# Altium schematic symbol library Capacitor - Aluminium TH.SchLib: 4591 symbols (part 22 of 27) (continued)
## UPS2V010MPD1TD (continued)
CAP ALUM 1UF 20% 350V RADIAL; Part Number: UPS2V010MPD1TD; Manufacturer: Nichicon; TemperatureRange: -40C ~ 105C; Type: Polar; Ripple Current: 17mA @ 120Hz; Value: 1uF; PartId: 24895; Supplier 1: Digi-Key; Supplier Part Number 1: 493-11690-1-ND; ComponentLink1Description: Datasheet; ComponentLink1URL: http://nichicon-us.com/english/products/pdfs/e-ups.pdf; ComponentLink2Description: Digi-Key Listing; ComponentLink2URL: https://www.digikey.com/product-detail/en/nichicon/UPS2V010MPD1TD/493-11690-1-ND/4319779; Tolerance: 20%; Voltage: 350V; Price: 0.48; Device Package: Radial, Can, 10mm
footprint CAP AL TH D10 L5 H14.5
pins: 1, 2

## UPS2V100MHD1TO
designator C?, comment 10uF  (value not drawn)
CAP ALUM 10UF 20% 350V RADIAL; Part Number: UPS2V100MHD1TO; Manufacturer: Nichicon; TemperatureRange: -40C ~ 105C; Type: Polar; Ripple Current: 82mA @ 120Hz; Value: 10uF; PartId: 23254; Supplier 1: Digi-Key; Supplier Part Number 1: 493-11986-1-ND; ComponentLink1Description: Datasheet; ComponentLink1URL: http://nichicon-us.com/english/products/pdfs/e-ups.pdf; ComponentLink2Description: Digi-Key Listing; ComponentLink2URL: https://www.digikey.com/product-detail/en/nichicon/UPS2V100MHD1TO/493-11986-1-ND/4319780; Tolerance: 20%; Voltage: 350V; Price: 0.71; Device Package: Radial, Can, 12.5mm
footprint CAP AL TH D12.5 L5 H22
pins: 1, 2

## UPS2V220MHD1TN
designator C?, comment 22uF  (value not drawn)
CAP ALUM 22UF 20% 350V RADIAL; Part Number: UPS2V220MHD1TN; Manufacturer: Nichicon; TemperatureRange: -40C ~ 105C; Type: Polar; Ripple Current: 130mA @ 120Hz; Value: 22uF; PartId: 26735; Supplier 1: Digi-Key; Supplier Part Number 1: 493-5414-3-ND; ComponentLink1Description: Datasheet; ComponentLink1URL: http://nichicon-us.com/english/products/pdfs/e-ups.pdf; ComponentLink2Description: Digi-Key Listing; ComponentLink2URL: https://www.digikey.com/product-detail/en/nichicon/UPS2V220MHD1TN/493-5414-3-ND/3130419; Tolerance: 20%; Voltage: 350V; Price: 0.4664; Device Package: Radial, Can, 16mm
footprint CAP AL TH D16 L7.5 H27
pins: 1, 2

## UPS2V221MRD
designator C?, comment 220uF  (value not drawn)
CAP ALUM 220UF 20% 350V RADIAL; Part Number: UPS2V221MRD; Manufacturer: Nichicon; TemperatureRange: -40C ~ 105C; Type: Polar; Ripple Current: 550mA; Value: 220uF; PartId: 27530; Supplier 1: Digi-Key; Supplier Part Number 1: 493-11161-ND; ComponentLink1Description: Datasheet; ComponentLink1URL: http://nichicon-us.com/english/products/pdfs/e-ups.pdf; ComponentLink2Description: Digi-Key Listing; ComponentLink2URL: https://www.digikey.com/product-detail/en/nichicon/UPS2V221MRD/493-11161-ND/2600159; Tolerance: 20%; Voltage: 350V; Price: 4.42; Device Package: Radial, Can, 25mm
footprint CAP AL TH D25 L12.5 H52
pins: 1, 2

## UPS2V330MHD
designator C?, comment 33uF  (value not drawn)
CAP ALUM 33UF 20% 350V RADIAL; Part Number: UPS2V330MHD; Manufacturer: Nichicon; TemperatureRange: -40C ~ 105C; Type: Polar; Ripple Current: 160mA @ 120Hz; Value: 33uF; PartId: 27103; Supplier 1: Digi-Key; Supplier Part Number 1: 493-5677-ND; ComponentLink1Description: Datasheet; ComponentLink1URL: http://nichicon-us.com/english/products/pdfs/e-ups.pdf; ComponentLink2Description: Digi-Key Listing; ComponentLink2URL: https://www.digikey.com/product-detail/en/nichicon/UPS2V330MHD/493-5677-ND/2600161; Tolerance: 20%; Voltage: 350V; Price: 1.74; Device Package: Radial, Can, 16mm
footprint CAP AL TH D16 L7.5 H33.5
pins: 1, 2

## UPS2W2R2MPD1TD
designator C?, comment 2.2uF  (value not drawn)
CAP ALUM 2.2UF 20% 450V RADIAL; Part Number: UPS2W2R2MPD1TD; Manufacturer: Nichicon; TemperatureRange: -25C ~ 105C; Type: Polar; Ripple Current: 29mA @ 120Hz; Value: 2.2uF; PartId: 25724; Supplier 1: Digi-Key; Supplier Part Number 1: 493-5418-3-ND; ComponentLink1Description: Datasheet; ComponentLink1URL: http://nichicon-us.com/english/products/pdfs/e-ups.pdf; ComponentLink2Description: Digi-Key Listing; ComponentLink2URL: https://www.digikey.com/product-detail/en/nichicon/UPS2W2R2MPD1TD/493-5418-3-ND/3130423; Tolerance: 20%; Voltage: 450V; Price: 0.1527; Device Package: Radial, Can, 10mm
footprint CAP AL TH D10 L5 H22
pins: 1, 2

## UPS2W3R3MHD1TO
designator C?, comment 3.3uF  (value not drawn)
CAP ALUM 3.3UF 20% 450V RADIAL; Part Number: UPS2W3R3MHD1TO; Manufacturer: Nichicon; TemperatureRange: -25C ~ 105C; Type: Polar; Ripple Current: 41mA @ 120Hz; Value: 3.3uF; PartId: 23121; Supplier 1: Digi-Key; Supplier Part Number 1: 493-5419-3-ND; ComponentLink1Description: Datasheet; ComponentLink1URL: http://nichicon-us.com/english/products/pdfs/e-ups.pdf; ComponentLink2Description: Digi-Key Listing; ComponentLink2URL: https://www.digikey.com/product-detail/en/nichicon/UPS2W3R3MHD1TO/493-5419-3-ND/3130424; Tolerance: 20%; Voltage: 450V; Price: 0.1678; Device Package: Radial, Can, 12.5mm
footprint CAP AL TH D12.5 L5 H22
pins: 1, 2

## UPS2W4R7MHD1TO
designator C?, comment 4.7uF  (value not drawn)
CAP ALUM 4.7UF 20% 450V RADIAL; Part Number: UPS2W4R7MHD1TO; Manufacturer: Nichicon; TemperatureRange: -25C ~ 105C; Type: Polar; Ripple Current: 49mA @ 120Hz; Value: 4.7uF; PartId: 23123; Supplier 1: Digi-Key; Supplier Part Number 1: 493-5420-3-ND; ComponentLink1Description: Datasheet; ComponentLink1URL: http://nichicon-us.com/english/products/pdfs/e-ups.pdf; ComponentLink2Description: Digi-Key Listing; ComponentLink2URL: https://www.digikey.com/product-detail/en/nichicon/UPS2W4R7MHD1TO/493-5420-3-ND/3130425; Tolerance: 20%; Voltage: 450V; Price: 0.2068; Device Package: Radial, Can, 12.5mm
footprint CAP AL TH D12.5 L5 H22
pins: 1, 2

## UPS2W010MPD
designator C?, comment 1uF  (value not drawn)
CAP ALUM 1UF 20% 450V RADIAL; Part Number: UPS2W010MPD; Manufacturer: Nichicon; TemperatureRange: -25C ~ 105C; Type: Polar; Ripple Current: 18mA @ 120Hz; Value: 1uF; PartId: 24934; Supplier 1: Digi-Key; Supplier Part Number 1: UPS2W010MPD-ND; ComponentLink1Description: Datasheet; ComponentLink1URL: http://nichicon-us.com/english/products/pdfs/e-ups.pdf; ComponentLink2Description: Digi-Key Listing; ComponentLink2URL: https://www.digikey.com/product-detail/en/nichicon/UPS2W010MPD/UPS2W010MPD-ND/2600167; Tolerance: 20%; Voltage: 450V; Price: 0.5; Device Package: Radial, Can, 10mm
footprint CAP AL TH D10 L5 H14.5
pins: 1, 2

## UPS2W010MPD1TD
designator C?, comment 1uF  (value not drawn)
CAP ALUM 1UF 20% 450V RADIAL; Part Number: UPS2W010MPD1TD; Manufacturer: Nichicon; TemperatureRange: -25C ~ 105C; Type: Polar; Ripple Current: 18mA @ 120Hz; Value: 1uF; PartId: 24513; Supplier 1: Digi-Key; Supplier Part Number 1: 493-11672-3-ND; ComponentLink1Description: Datasheet; ComponentLink1URL: http://nichicon-us.com/english/products/pdfs/e-ups.pdf; ComponentLink2Description: Digi-Key Listing; ComponentLink2URL: https://www.digikey.com/product-detail/en/nichicon/UPS2W010MPD1TD/493-11672-3-ND/4320815; Tolerance: 20%; Voltage: 450V; Price: 0.1273; Device Package: Radial, Can, 10mm
footprint CAP AL TH D10 L5 H14.5
pins: 1, 2

## UPS2W101MRD
designator C?, comment 100uF  (value not drawn)
CAP ALUM 100UF 20% 450V RADIAL; Part Number: UPS2W101MRD; Manufacturer: Nichicon; TemperatureRange: -25C ~ 105C; Type: Polar; Ripple Current: 350mA @ 120Hz; Value: 100uF; PartId: 27520; Supplier 1: Digi-Key; Supplier Part Number 1: 493-5680-ND; ComponentLink1Description: Datasheet; ComponentLink1URL: http://nichicon-us.com/english/products/pdfs/e-ups.pdf; ComponentLink2Description: Digi-Key Listing; ComponentLink2URL: https://www.digikey.com/product-detail/en/nichicon/UPS2W101MRD/493-5680-ND/2600169; Tolerance: 20%; Voltage: 450V; Price: 4.64; Device Package: Radial, Can, 25mm
footprint CAP AL TH D25 L12.5 H52
pins: 1, 2

## UPS2W220MHD
designator C?, comment 22uF  (value not drawn)
CAP ALUM 22UF 20% 450V RADIAL; Part Number: UPS2W220MHD; Manufacturer: Nichicon; TemperatureRange: -25C ~ 105C; Type: Polar; Ripple Current: 115mA; Value: 22uF; PartId: 26993; Supplier 1: Digi-Key; Supplier Part Number 1: 493-11162-ND; ComponentLink1Description: Datasheet; ComponentLink1URL: http://nichicon-us.com/english/products/pdfs/e-ups.pdf; ComponentLink2Description: Digi-Key Listing; ComponentLink2URL: https://www.digikey.com/product-detail/en/nichicon/UPS2W220MHD/493-11162-ND/2600170; Tolerance: 20%; Voltage: 450V; Price: 1.3; Device Package: Radial, Can, 16mm
footprint CAP AL TH D16 L7.5 H33.5
pins: 1, 2

## UPT2D101MHD
designator C?, comment 100uF  (value not drawn)
CAP ALUM 100UF 20% 200V RADIAL; Part Number: UPT2D101MHD; Manufacturer: Nichicon; TemperatureRange: -25C ~ 105C; Ripple Current: 480mA; Value: 100uF; PartId: 24330; Supplier 1: Digi-Key; Supplier Part Number 1: 493-11164-ND; ComponentLink1Description: Datasheet; ComponentLink1URL: http://nichicon-us.com/english/products/pdfs/e-upt.pdf; ComponentLink2Description: Digi-Key Listing; ComponentLink2URL: https://www.digikey.com/product-detail/en/nichicon/UPT2D101MHD/493-11164-ND/2600177; Tolerance: 20%; Voltage: 200V; Price: 1.29; Device Package: Radial, Can, 12.5mm
footprint CAP AL TH D12.5 L5 H35.5
pins: 1, 2

## UPT2D121MHD
designator C?, comment 120uF  (value not drawn)
CAP ALUM 120UF 20% 200V RADIAL; Part Number: UPT2D121MHD; Manufacturer: Nichicon; TemperatureRange: -25C ~ 105C; Ripple Current: 530mA; Value: 120uF; PartId: 24345; Supplier 1: Digi-Key; Supplier Part Number 1: 493-11165-ND; ComponentLink1Description: Datasheet; ComponentLink1URL: http://nichicon-us.com/english/products/pdfs/e-upt.pdf; ComponentLink2Description: Digi-Key Listing; ComponentLink2URL: https://www.digikey.com/product-detail/en/nichicon/UPT2D121MHD/493-11165-ND/1995781; Tolerance: 20%; Voltage: 200V; Price: 1.39; Device Package: Radial, Can, 12.5mm
footprint CAP AL TH D12.5 L5 H35.5
pins: 1, 2

## UPT2D221MHD
designator C?, comment 220uF  (value not drawn)
CAP ALUM 220UF 20% 200V RADIAL; Part Number: UPT2D221MHD; Manufacturer: Nichicon; TemperatureRange: -25C ~ 105C; Type: Polar; Ripple Current: 760mA @ 120Hz; Value: 220uF; PartId: 27203; Supplier 1: Digi-Key; Supplier Part Number 1: 493-5685-ND; ComponentLink1Description: Datasheet; ComponentLink1URL: http://nichicon-us.com/english/products/pdfs/e-upt.pdf; ComponentLink2Description: Digi-Key Listing; ComponentLink2URL: https://www.digikey.com/product-detail/en/nichicon/UPT2D221MHD/493-5685-ND/2600180; Tolerance: 20%; Voltage: 200V; Price: 2.1; Device Package: Radial, Can, 16mm
footprint CAP AL TH D16 L7.5 H33.5
pins: 1, 2

## UPT2D471MRD
designator C?, comment 470uF  (value not drawn)
CAP ALUM 470UF 20% 200V RADIAL; Part Number: UPT2D471MRD; Manufacturer: Nichicon; TemperatureRange: -25C ~ 105C; Ripple Current: 1.2A; Value: 470uF; PartId: 27576; Supplier 1: Digi-Key; Supplier Part Number 1: 493-11168-ND; ComponentLink1Description: Datasheet; ComponentLink1URL: http://nichicon-us.com/english/products/pdfs/e-upt.pdf; ComponentLink2Description: Digi-Key Listing; ComponentLink2URL: https://www.digikey.com/product-detail/en/nichicon/UPT2D471MRD/493-11168-ND/2600185; Tolerance: 20%; Voltage: 200V; Price: 3.73; Device Package: Radial, Can, 22mm
footprint CAP AL TH D22 L10 H43
pins: 1, 2

## UPT2D681MRD
designator C?, comment 680uF  (value not drawn)
CAP ALUM 680UF 20% 200V RADIAL; Part Number: UPT2D681MRD; Manufacturer: Nichicon; TemperatureRange: -25C ~ 105C; Ripple Current: 1.5A; Value: 680uF; PartId: 27630; Supplier 1: Digi-Key; Supplier Part Number 1: 493-11171-ND; ComponentLink1Description: Datasheet; ComponentLink1URL: http://nichicon-us.com/english/products/pdfs/e-upt.pdf; ComponentLink2Description: Digi-Key Listing; ComponentLink2URL: https://www.digikey.com/product-detail/en/nichicon/UPT2D681MRD/493-11171-ND/2600187; Tolerance: 20%; Voltage: 200V; Price: 4.57; Device Package: Radial, Can, 22mm
footprint CAP AL TH D22 L10 H53
pins: 1, 2

## UPT2D681MRD6
designator C?, comment 680uF  (value not drawn)
CAP ALUM 680UF 20% 200V RADIAL; Part Number: UPT2D681MRD6; Manufacturer: Nichicon; TemperatureRange: -25C ~ 105C; Ripple Current: 1.5A; Value: 680uF; PartId: 27486; Supplier 1: Digi-Key; Supplier Part Number 1: 493-11170-ND; ComponentLink1Description: Datasheet; ComponentLink1URL: http://nichicon-us.com/english/products/pdfs/e-upt.pdf; ComponentLink2Description: Digi-Key Listing; ComponentLink2URL: https://www.digikey.com/product-detail/en/nichicon/UPT2D681MRD6/493-11170-ND/2600188; Tolerance: 20%; Voltage: 200V; Price: 4.74; Device Package: Radial, Can, 25mm
footprint CAP AL TH D25 L12.5 H42
pins: 1, 2

## UPT2D820MHD1TO
designator C?, comment 82uF  (value not drawn)
CAP ALUM 82UF 20% 200V RADIAL; Part Number: UPT2D820MHD1TO; Manufacturer: Nichicon; TemperatureRange: -25C ~ 105C; Type: Polar; Ripple Current: 410mA @ 120Hz; Value: 82uF; PartId: 24102; Supplier 1: Digi-Key; Supplier Part Number 1: 493-12268-1-ND; ComponentLink1Description: Datasheet; ComponentLink1URL: http://nichicon-us.com/english/products/pdfs/e-upt.pdf; ComponentLink2Description: Digi-Key Listing; ComponentLink2URL: https://www.digikey.com/product-detail/en/nichicon/UPT2D820MHD1TO/493-12268-1-ND/4319784; Tolerance: 20%; Voltage: 200V; Price: 1.33; Device Package: Radial, Can, 12.5mm
footprint CAP AL TH D12.5 L5 H27
pins: 1, 2

## UPT2D821MRD
designator C?, comment 820uF  (value not drawn)
CAP ALUM 820UF 20% 200V RADIAL; Part Number: UPT2D821MRD; Manufacturer: Nichicon; TemperatureRange: -25C ~ 105C; Ripple Current: 1.6A; Value: 820uF; PartId: 27524; Supplier 1: Digi-Key; Supplier Part Number 1: 493-11172-ND; ComponentLink1Description: Datasheet; ComponentLink1URL: http://nichicon-us.com/english/products/pdfs/e-upt.pdf; ComponentLink2Description: Digi-Key Listing; ComponentLink2URL: https://www.digikey.com/product-detail/en/nichicon/UPT2D821MRD/493-11172-ND/2600190; Tolerance: 20%; Voltage: 200V; Price: 5.76; Device Package: Radial, Can, 25mm
footprint CAP AL TH D25 L12.5 H52
pins: 1, 2

## UPT2E151MHD
designator C?, comment 150uF  (value not drawn)
CAP ALUM 150UF 20% 250V RADIAL; Part Number: UPT2E151MHD; Manufacturer: Nichicon; TemperatureRange: -25C ~ 105C; Ripple Current: 620mA; Value: 150uF; PartId: 27197; Supplier 1: Digi-Key; Supplier Part Number 1: 493-11174-ND; ComponentLink1Description: Datasheet; ComponentLink1URL: http://nichicon-us.com/english/products/pdfs/e-upt.pdf; ComponentLink2Description: Digi-Key Listing; ComponentLink2URL: https://www.digikey.com/product-detail/en/nichicon/UPT2E151MHD/493-11174-ND/2600193; Tolerance: 20%; Voltage: 250V; Price: 2.06; Device Package: Radial, Can, 16mm
footprint CAP AL TH D16 L7.5 H33.5
pins: 1, 2

## UPT2E181MHD
designator C?, comment 180uF  (value not drawn)
CAP ALUM 180UF 20% 250V RADIAL; Part Number: UPT2E181MHD; Manufacturer: Nichicon; TemperatureRange: -25C ~ 105C; Type: Polar; Ripple Current: 720mA @ 120Hz; Value: 180uF; PartId: 27410; Supplier 1: Digi-Key; Supplier Part Number 1: 493-5689-ND; ComponentLink1Description: Datasheet; ComponentLink1URL: http://nichicon-us.com/english/products/pdfs/e-upt.pdf; ComponentLink2Description: Digi-Key Listing; ComponentLink2URL: https://www.digikey.com/product-detail/en/nichicon/UPT2E181MHD/493-5689-ND/2600194; Tolerance: 20%; Voltage: 250V; Price: 2.35; Device Package: Radial, Can, 16mm
footprint CAP AL TH D16 L7.5 H37
pins: 1, 2

## UPT2E331MRD
designator C?, comment 330uF  (value not drawn)
CAP ALUM 330UF 20% 250V RADIAL; Part Number: UPT2E331MRD; Manufacturer: Nichicon; TemperatureRange: -25C ~ 105C; Ripple Current: 1.05A; Value: 330uF; PartId: 27584; Supplier 1: Digi-Key; Supplier Part Number 1: 493-11313-ND; ComponentLink1Description: Datasheet; ComponentLink1URL: http://nichicon-us.com/english/products/pdfs/e-upt.pdf; ComponentLink2Description: Digi-Key Listing; ComponentLink2URL: https://www.digikey.com/product-detail/en/nichicon/UPT2E331MRD/493-11313-ND/4319378; Tolerance: 20%; Voltage: 250V; Price: 4.28; Device Package: Radial, Can, 22mm
footprint CAP AL TH D22 L10 H43
pins: 1, 2

## UPT2E471MRD
designator C?, comment 470uF  (value not drawn)
CAP ALUM 470UF 20% 250V RADIAL; Part Number: UPT2E471MRD; Manufacturer: Nichicon; TemperatureRange: -25C ~ 105C; Type: Polar; Ripple Current: 1.45A @ 120Hz; Value: 470uF; PartId: 27631; Supplier 1: Digi-Key; Supplier Part Number 1: 493-5693-ND; ComponentLink1Description: Datasheet; ComponentLink1URL: http://nichicon-us.com/english/products/pdfs/e-upt.pdf; ComponentLink2Description: Digi-Key Listing; ComponentLink2URL: https://www.digikey.com/product-detail/en/nichicon/UPT2E471MRD/493-5693-ND/2600200; Tolerance: 20%; Voltage: 250V; Price: 4.57; Device Package: Radial, Can, 22mm
footprint CAP AL TH D22 L10 H53
pins: 1, 2

## UPT2E471MRD6
designator C?, comment 470uF  (value not drawn)
CAP ALUM 470UF 20% 250V RADIAL; Part Number: UPT2E471MRD6; Manufacturer: Nichicon; TemperatureRange: -25C ~ 105C; Ripple Current: 1.45A; Value: 470uF; PartId: 27489; Supplier 1: Digi-Key; Supplier Part Number 1: 493-11177-ND; ComponentLink1Description: Datasheet; ComponentLink1URL: http://nichicon-us.com/english/products/pdfs/e-upt.pdf; ComponentLink2Description: Digi-Key Listing; ComponentLink2URL: https://www.digikey.com/product-detail/en/nichicon/UPT2E471MRD6/493-11177-ND/2600201; Tolerance: 20%; Voltage: 250V; Price: 4.64; Device Package: Radial, Can, 25mm
footprint CAP AL TH D25 L12.5 H42
pins: 1, 2

## UPT2E560MHD1TO
designator C?, comment 56uF  (value not drawn)
CAP ALUM 56UF 20% 250V RADIAL; Part Number: UPT2E560MHD1TO; Manufacturer: Nichicon; TemperatureRange: -25C ~ 105C; Type: Polar; Ripple Current: 310mA @ 120Hz; Value: 56uF; PartId: 24064; Supplier 1: Digi-Key; Supplier Part Number 1: 493-12219-1-ND; ComponentLink1Description: Datasheet; ComponentLink1URL: http://nichicon-us.com/english/products/pdfs/e-upt.pdf; ComponentLink2Description: Digi-Key Listing; ComponentLink2URL: https://www.digikey.com/product-detail/en/nichicon/UPT2E560MHD1TO/493-12219-1-ND/4319785; Tolerance: 20%; Voltage: 250V; Price: 1.18; Device Package: Radial, Can, 12.5mm
footprint CAP AL TH D12.5 L5 H27
pins: 1, 2

## UPT2E561MRD
designator C?, comment 560uF  (value not drawn)
CAP ALUM 560UF 20% 250V RADIAL; Part Number: UPT2E561MRD; Manufacturer: Nichicon; TemperatureRange: -25C ~ 105C; Ripple Current: 1.55A; Value: 560uF; PartId: 27545; Supplier 1: Digi-Key; Supplier Part Number 1: 493-11178-ND; ComponentLink1Description: Datasheet; ComponentLink1URL: http://nichicon-us.com/english/products/pdfs/e-upt.pdf; ComponentLink2Description: Digi-Key Listing; ComponentLink2URL: https://www.digikey.com/product-detail/en/nichicon/UPT2E561MRD/493-11178-ND/2600203; Tolerance: 20%; Voltage: 250V; Price: 5.76; Device Package: Radial, Can, 25mm
footprint CAP AL TH D25 L12.5 H52
pins: 1, 2

## UPT2E680MHD
designator C?, comment 68uF  (value not drawn)
CAP ALUM 68UF 20% 250V RADIAL; Part Number: UPT2E680MHD; Manufacturer: Nichicon; TemperatureRange: -25C ~ 105C; Type: Polar; Ripple Current: 360mA @ 120Hz; Value: 68uF; PartId: 24327; Supplier 1: Digi-Key; Supplier Part Number 1: 493-5694-ND; ComponentLink1Description: Datasheet; ComponentLink1URL: http://nichicon-us.com/english/products/pdfs/e-upt.pdf; ComponentLink2Description: Digi-Key Listing; ComponentLink2URL: https://www.digikey.com/product-detail/en/nichicon/UPT2E680MHD/493-5694-ND/2600204; Tolerance: 20%; Voltage: 250V; Price: 1.29; Device Package: Radial, Can, 12.5mm
footprint CAP AL TH D12.5 L5 H35.5
pins: 1, 2

## UPT2E820MHD
designator C?, comment 82uF  (value not drawn)
CAP ALUM 82UF 20% 250V RADIAL; Part Number: UPT2E820MHD; Manufacturer: Nichicon; TemperatureRange: -25C ~ 105C; Type: Polar; Ripple Current: 400mA @ 120Hz; Value: 82uF; PartId: 24348; Supplier 1: Digi-Key; Supplier Part Number 1: 493-5695-ND; ComponentLink1Description: Datasheet; ComponentLink1URL: http://nichicon-us.com/english/products/pdfs/e-upt.pdf; ComponentLink2Description: Digi-Key Listing; ComponentLink2URL: https://www.digikey.com/product-detail/en/nichicon/UPT2E820MHD/493-5695-ND/2600205; Tolerance: 20%; Voltage: 250V; Price: 1.39; Device Package: Radial, Can, 12.5mm
footprint CAP AL TH D12.5 L5 H35.5
pins: 1, 2

## UPT2G101MHD
designator C?, comment 100uF  (value not drawn)
CAP ALUM 100UF 20% 400V RADIAL; Part Number: UPT2G101MHD; Manufacturer: Nichicon; TemperatureRange: -25C ~ 105C; Ripple Current: 580mA; Value: 100uF; PartId: 27420; Supplier 1: Digi-Key; Supplier Part Number 1: 493-11180-ND; ComponentLink1Description: Datasheet; ComponentLink1URL: http://nichicon-us.com/english/products/pdfs/e-upt.pdf; ComponentLink2Description: Digi-Key Listing; ComponentLink2URL: https://www.digikey.com/product-detail/en/nichicon/UPT2G101MHD/493-11180-ND/2600206; Tolerance: 20%; Voltage: 400V; Price: 2.69; Device Package: Radial, Can, 16mm
footprint CAP AL TH D16 L7.5 H37
pins: 1, 2

## UPT2G181MRD
designator C?, comment 180uF  (value not drawn)
CAP ALUM 180UF 20% 400V RADIAL; Part Number: UPT2G181MRD; Manufacturer: Nichicon; TemperatureRange: -25C ~ 105C; Type: Polar; Ripple Current: 850mA @ 120Hz; Value: 180uF; PartId: 27596; Supplier 1: Digi-Key; Supplier Part Number 1: 493-5696-ND; ComponentLink1Description: Datasheet; ComponentLink1URL: http://nichicon-us.com/english/products/pdfs/e-upt.pdf; ComponentLink2Description: Digi-Key Listing; ComponentLink2URL: https://www.digikey.com/product-detail/en/nichicon/UPT2G181MRD/493-5696-ND/2600211; Tolerance: 20%; Voltage: 400V; Price: 3.89; Device Package: Radial, Can, 22mm
footprint CAP AL TH D22 L10 H43
pins: 1, 2

## UPT2G270MHD1TO
designator C?, comment 27uF  (value not drawn)
CAP ALUM 27UF 20% 400V RADIAL; Part Number: UPT2G270MHD1TO; Manufacturer: Nichicon; TemperatureRange: -25C ~ 105C; Type: Polar; Ripple Current: 240mA @ 120Hz; Value: 27uF; PartId: 23834; Supplier 1: Digi-Key; Supplier Part Number 1: 493-12220-3-ND; ComponentLink1Description: Datasheet; ComponentLink1URL: http://nichicon-us.com/english/products/pdfs/e-upt.pdf; ComponentLink2Description: Digi-Key Listing; ComponentLink2URL: https://www.digikey.com/product-detail/en/nichicon/UPT2G270MHD1TO/493-12220-3-ND/4321363; Tolerance: 20%; Voltage: 400V; Price: 0.4695; Device Package: Radial, Can, 12.5mm
footprint CAP AL TH D12.5 L5 H27
pins: 1, 2

## UPT2G271MRD
designator C?, comment 270uF  (value not drawn)
CAP ALUM 270UF 20% 400V RADIAL; Part Number: UPT2G271MRD; Manufacturer: Nichicon; TemperatureRange: -25C ~ 105C; Ripple Current: 1.3A; Value: 270uF; PartId: 27669; Supplier 1: Digi-Key; Supplier Part Number 1: 493-11186-ND; ComponentLink1Description: Datasheet; ComponentLink1URL: http://nichicon-us.com/english/products/pdfs/e-upt.pdf; ComponentLink2Description: Digi-Key Listing; ComponentLink2URL: https://www.digikey.com/product-detail/en/nichicon/UPT2G271MRD/493-11186-ND/2600214; Tolerance: 20%; Voltage: 400V; Price: 5.18; Device Package: Radial, Can, 22mm
footprint CAP AL TH D22 L10 H53
pins: 1, 2

## UPT2G271MRD6
designator C?, comment 270uF  (value not drawn)
CAP ALUM 270UF 20% 400V RADIAL; Part Number: UPT2G271MRD6; Manufacturer: Nichicon; TemperatureRange: -25C ~ 105C; Ripple Current: 1.3A; Value: 270uF; PartId: 27496; Supplier 1: Digi-Key; Supplier Part Number 1: 493-11185-ND; ComponentLink1Description: Datasheet; ComponentLink1URL: http://nichicon-us.com/english/products/pdfs/e-upt.pdf; ComponentLink2Description: Digi-Key Listing; ComponentLink2URL: https://www.digikey.com/product-detail/en/nichicon/UPT2G271MRD6/493-11185-ND/2600215; Tolerance: 20%; Voltage: 400V; Price: 5.38; Device Package: Radial, Can, 25mm
footprint CAP AL TH D25 L12.5 H42
pins: 1, 2

## UPT2G330MHD
designator C?, comment 33uF  (value not drawn)
CAP ALUM 33UF 20% 400V RADIAL; Part Number: UPT2G330MHD; Manufacturer: Nichicon; TemperatureRange: -25C ~ 105C; Type: Polar; Ripple Current: 290mA @ 120Hz; Value: 33uF; PartId: 24331; Supplier 1: Digi-Key; Supplier Part Number 1: 493-5697-ND; ComponentLink1Description: Datasheet; ComponentLink1URL: http://nichicon-us.com/english/products/pdfs/e-upt.pdf; ComponentLink2Description: Digi-Key Listing; ComponentLink2URL: https://www.digikey.com/product-detail/en/nichicon/UPT2G330MHD/493-5697-ND/2600216; Tolerance: 20%; Voltage: 400V; Price: 1.29; Device Package: Radial, Can, 12.5mm
footprint CAP AL TH D12.5 L5 H35.5
pins: 1, 2

## UPT2G331MRD
designator C?, comment 330uF  (value not drawn)
CAP ALUM 330UF 20% 400V RADIAL; Part Number: UPT2G331MRD; Manufacturer: Nichicon; TemperatureRange: -25C ~ 105C; Ripple Current: 1.4A; Value: 330uF; PartId: 27527; Supplier 1: Digi-Key; Supplier Part Number 1: 493-11187-ND; ComponentLink1Description: Datasheet; ComponentLink1URL: http://nichicon-us.com/english/products/pdfs/e-upt.pdf; ComponentLink2Description: Digi-Key Listing; ComponentLink2URL: https://www.digikey.com/product-detail/en/nichicon/UPT2G331MRD/493-11187-ND/2600217; Tolerance: 20%; Voltage: 400V; Price: 6.03; Device Package: Radial, Can, 25mm
footprint CAP AL TH D25 L12.5 H52
pins: 1, 2

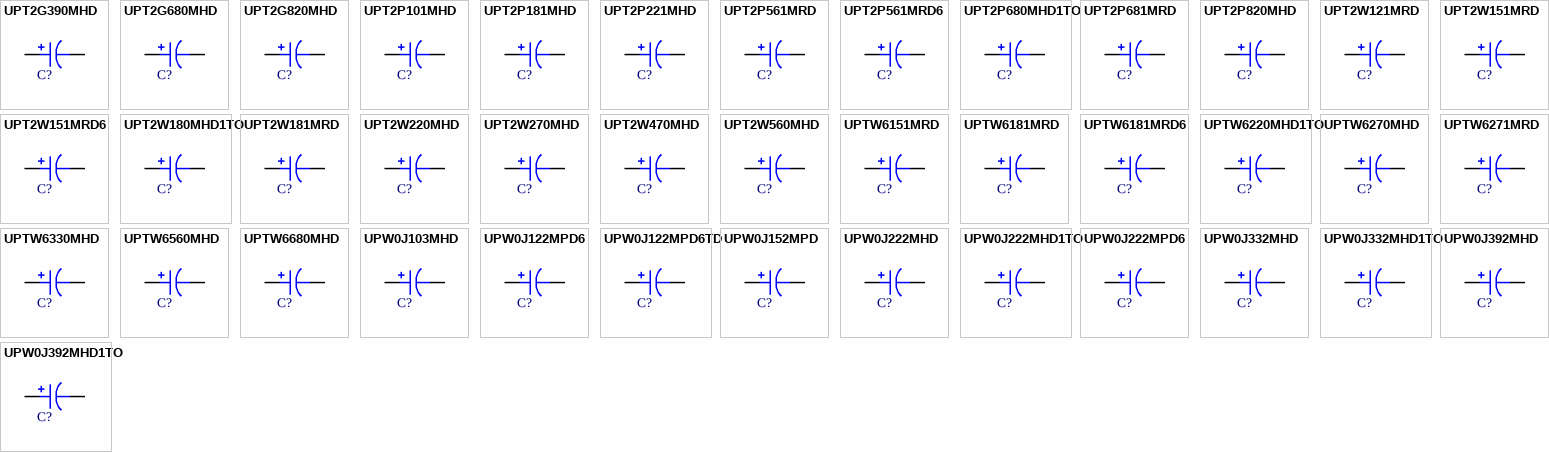
[diagram p93: symbols UPT2G390MHD to UPW0J392MHD1TO]

## UPT2G390MHD
designator C?, comment 39uF  (value not drawn)
CAP ALUM 39UF 20% 400V RADIAL; Part Number: UPT2G390MHD; Manufacturer: Nichicon; TemperatureRange: -25C ~ 105C; Ripple Current: 320mA; Value: 39uF; PartId: 24351; Supplier 1: Digi-Key; Supplier Part Number 1: 493-11188-ND; ComponentLink1Description: Datasheet; ComponentLink1URL: http://nichicon-us.com/english/products/pdfs/e-upt.pdf; ComponentLink2Description: Digi-Key Listing; ComponentLink2URL: https://www.digikey.com/product-detail/en/nichicon/UPT2G390MHD/493-11188-ND/2600218; Tolerance: 20%; Voltage: 400V; Price: 1.39; Device Package: Radial, Can, 12.5mm
footprint CAP AL TH D12.5 L5 H35.5
pins: 1, 2

## UPT2G680MHD
designator C?, comment 68uF  (value not drawn)
CAP ALUM 68UF 20% 400V RADIAL; Part Number: UPT2G680MHD; Manufacturer: Nichicon; TemperatureRange: -25C ~ 105C; Type: Polar; Ripple Current: 460mA @ 120Hz; Value: 68uF; PartId: 27196; Supplier 1: Digi-Key; Supplier Part Number 1: 493-5699-ND; ComponentLink1Description: Datasheet; ComponentLink1URL: http://nichicon-us.com/english/products/pdfs/e-upt.pdf; ComponentLink2Description: Digi-Key Listing; ComponentLink2URL: https://www.digikey.com/product-detail/en/nichicon/UPT2G680MHD/493-5699-ND/2600221; Tolerance: 20%; Voltage: 400V; Price: 2.06; Device Package: Radial, Can, 16mm
footprint CAP AL TH D16 L7.5 H33.5
pins: 1, 2

## UPT2G820MHD
designator C?, comment 82uF  (value not drawn)
CAP ALUM 82UF 20% 400V RADIAL; Part Number: UPT2G820MHD; Manufacturer: Nichicon; TemperatureRange: -25C ~ 105C; Type: Polar; Ripple Current: 500mA @ 120Hz; Value: 82uF; PartId: 27214; Supplier 1: Digi-Key; Supplier Part Number 1: 493-5700-ND; ComponentLink1Description: Datasheet; ComponentLink1URL: http://nichicon-us.com/english/products/pdfs/e-upt.pdf; ComponentLink2Description: Digi-Key Listing; ComponentLink2URL: https://www.digikey.com/product-detail/en/nichicon/UPT2G820MHD/493-5700-ND/2600222; Tolerance: 20%; Voltage: 400V; Price: 2.3; Device Package: Radial, Can, 16mm
footprint CAP AL TH D16 L7.5 H33.5
pins: 1, 2

## UPT2P101MHD
designator C?, comment 100uF  (value not drawn)
CAP ALUM 100UF 20% 220V RADIAL; Part Number: UPT2P101MHD; Manufacturer: Nichicon; TemperatureRange: -25C ~ 105C; Ripple Current: 430mA; Value: 100uF; PartId: 24349; Supplier 1: Digi-Key; Supplier Part Number 1: 493-11190-ND; ComponentLink1Description: Datasheet; ComponentLink1URL: http://nichicon-us.com/english/products/pdfs/e-upt.pdf; ComponentLink2Description: Digi-Key Listing; ComponentLink2URL: https://www.digikey.com/product-detail/en/nichicon/UPT2P101MHD/493-11190-ND/2600223; Tolerance: 20%; Voltage: 220V; Price: 1.39; Device Package: Radial, Can, 12.5mm
footprint CAP AL TH D12.5 L5 H35.5
pins: 1, 2

## UPT2P181MHD
designator C?, comment 180uF  (value not drawn)
CAP ALUM 180UF 20% 220V RADIAL; Part Number: UPT2P181MHD; Manufacturer: Nichicon; TemperatureRange: -25C ~ 105C; Type: Polar; Ripple Current: 670mA @ 120Hz; Value: 180uF; PartId: 27173; Supplier 1: Digi-Key; Supplier Part Number 1: 493-5703-ND; ComponentLink1Description: Datasheet; ComponentLink1URL: http://nichicon-us.com/english/products/pdfs/e-upt.pdf; ComponentLink2Description: Digi-Key Listing; ComponentLink2URL: https://www.digikey.com/product-detail/en/nichicon/UPT2P181MHD/493-5703-ND/2600226; Tolerance: 20%; Voltage: 220V; Price: 1.9; Device Package: Radial, Can, 16mm
footprint CAP AL TH D16 L7.5 H33.5
pins: 1, 2

## UPT2P221MHD
designator C?, comment 220uF  (value not drawn)
CAP ALUM 220UF 20% 220V RADIAL; Part Number: UPT2P221MHD; Manufacturer: Nichicon; TemperatureRange: -25C ~ 105C; Type: Polar; Ripple Current: 770mA @ 120Hz; Value: 220uF; PartId: 27417; Supplier 1: Digi-Key; Supplier Part Number 1: 493-5704-ND; ComponentLink1Description: Datasheet; ComponentLink1URL: http://nichicon-us.com/english/products/pdfs/e-upt.pdf; ComponentLink2Description: Digi-Key Listing; ComponentLink2URL: https://www.digikey.com/product-detail/en/nichicon/UPT2P221MHD/493-5704-ND/2600227; Tolerance: 20%; Voltage: 220V; Price: 2.58; Device Package: Radial, Can, 16mm
footprint CAP AL TH D16 L7.5 H37
pins: 1, 2

## UPT2P561MRD
designator C?, comment 560uF  (value not drawn)
CAP ALUM 560UF 20% 220V RADIAL; Part Number: UPT2P561MRD; Manufacturer: Nichicon; TemperatureRange: -25C ~ 105C; Type: Polar; Ripple Current: 1.5A @ 120Hz; Value: 560uF; PartId: 27659; Supplier 1: Digi-Key; Supplier Part Number 1: 493-5708-ND; ComponentLink1Description: Datasheet; ComponentLink1URL: http://nichicon-us.com/english/products/pdfs/e-upt.pdf; ComponentLink2Description: Digi-Key Listing; ComponentLink2URL: https://www.digikey.com/product-detail/en/nichicon/UPT2P561MRD/493-5708-ND/2600234; Tolerance: 20%; Voltage: 220V; Price: 4.57; Device Package: Radial, Can, 22mm
footprint CAP AL TH D22 L10 H53
pins: 1, 2

## UPT2P561MRD6
designator C?, comment 560uF  (value not drawn)
CAP ALUM 560UF 20% 220V RADIAL; Part Number: UPT2P561MRD6; Manufacturer: Nichicon; TemperatureRange: -25C ~ 105C; Ripple Current: 1.5A; Value: 560uF; PartId: 27493; Supplier 1: Digi-Key; Supplier Part Number 1: 493-11194-ND; ComponentLink1Description: Datasheet; ComponentLink1URL: http://nichicon-us.com/english/products/pdfs/e-upt.pdf; ComponentLink2Description: Digi-Key Listing; ComponentLink2URL: https://www.digikey.com/product-detail/en/nichicon/UPT2P561MRD6/493-11194-ND/2600235; Tolerance: 20%; Voltage: 220V; Price: 4.6; Device Package: Radial, Can, 25mm
footprint CAP AL TH D25 L12.5 H42
pins: 1, 2

## UPT2P680MHD1TO
designator C?, comment 68uF  (value not drawn)
CAP ALUM 68UF 20% 220V RADIAL; Part Number: UPT2P680MHD1TO; Manufacturer: Nichicon; TemperatureRange: -25C ~ 105C; Type: Polar; Ripple Current: 340mA @ 120Hz; Value: 68uF; PartId: 23634; Supplier 1: Digi-Key; Supplier Part Number 1: 493-5421-3-ND; ComponentLink1Description: Datasheet; ComponentLink1URL: http://nichicon-us.com/english/products/pdfs/e-upt.pdf; ComponentLink2Description: Digi-Key Listing; ComponentLink2URL: https://www.digikey.com/product-detail/en/nichicon/UPT2P680MHD1TO/493-5421-3-ND/3130426; Tolerance: 20%; Voltage: 220V; Price: 0.4695; Device Package: Radial, Can, 12.5mm
footprint CAP AL TH D12.5 L5 H26.5
pins: 1, 2

## UPT2P681MRD
designator C?, comment 680uF  (value not drawn)
CAP ALUM 680UF 20% 220V RADIAL; Part Number: UPT2P681MRD; Manufacturer: Nichicon; TemperatureRange: -25C ~ 105C; Ripple Current: 1.6A; Value: 680uF; PartId: 27525; Supplier 1: Digi-Key; Supplier Part Number 1: 493-11195-ND; ComponentLink1Description: Datasheet; ComponentLink1URL: http://nichicon-us.com/english/products/pdfs/e-upt.pdf; ComponentLink2Description: Digi-Key Listing; ComponentLink2URL: https://www.digikey.com/product-detail/en/nichicon/UPT2P681MRD/493-11195-ND/2600237; Tolerance: 20%; Voltage: 220V; Price: 5.76; Device Package: Radial, Can, 25mm
footprint CAP AL TH D25 L12.5 H52
pins: 1, 2

## UPT2P820MHD
designator C?, comment 82uF  (value not drawn)
CAP ALUM 82UF 20% 220V RADIAL; Part Number: UPT2P820MHD; Manufacturer: Nichicon; TemperatureRange: -25C ~ 105C; Type: Polar; Ripple Current: 400mA @ 120Hz; Value: 82uF; PartId: 24329; Supplier 1: Digi-Key; Supplier Part Number 1: 493-5709-ND; ComponentLink1Description: Datasheet; ComponentLink1URL: http://nichicon-us.com/english/products/pdfs/e-upt.pdf; ComponentLink2Description: Digi-Key Listing; ComponentLink2URL: https://www.digikey.com/product-detail/en/nichicon/UPT2P820MHD/493-5709-ND/2600238; Tolerance: 20%; Voltage: 220V; Price: 1.29; Device Package: Radial, Can, 12.5mm
footprint CAP AL TH D12.5 L5 H35.5
pins: 1, 2

## UPT2W121MRD
designator C?, comment 120uF  (value not drawn)
CAP ALUM 120UF 20% 450V RADIAL; Part Number: UPT2W121MRD; Manufacturer: Nichicon; TemperatureRange: -25C ~ 105C; Ripple Current: 770mA; Value: 120uF; PartId: 27591; Supplier 1: Digi-Key; Supplier Part Number 1: 493-11197-ND; ComponentLink1Description: Datasheet; ComponentLink1URL: http://nichicon-us.com/english/products/pdfs/e-upt.pdf; ComponentLink2Description: Digi-Key Listing; ComponentLink2URL: https://www.digikey.com/product-detail/en/nichicon/UPT2W121MRD/493-11197-ND/2600240; Tolerance: 20%; Voltage: 450V; Price: 3.76; Device Package: Radial, Can, 22mm
footprint CAP AL TH D22 L10 H43
pins: 1, 2

## UPT2W151MRD
designator C?, comment 150uF  (value not drawn)